# Altium footprint library IC.PcbLib: 68 footprints (part 5 of 5)
Each footprint in its own frame and in the unit in brackets; x right, y up, seen from the top. Pads: shape width x height; smd on the part's side, far side on the other; paste and mask are expansions set on the pad; w line width, h text height; cw(c..) or ccw(c..) is an arc to the next point about the centre after c.
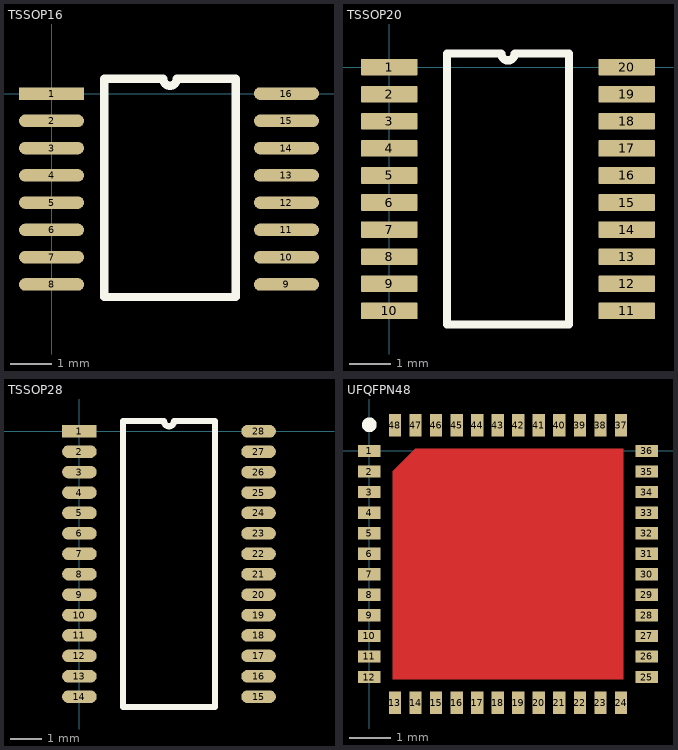
[diagram p4: the footprints below, top view; thin cyan lines are the x and y axes]

## TSSOP16 [mm]
pads (16):
  rect 1.55x0.3 smd: 1(0,0)
  oval 1.55x0.3 smd: 2(0,-0.65) 3(0,-1.3) 4(0,-1.95) 5(0,-2.6) 6(0,-3.25) 7(0,-3.9) 8(0,-4.55) 9(5.6,-4.55) 10(5.6,-3.9) 11(5.6,-3.25) 12(5.6,-2.6) 13(5.6,-1.95) 14(5.6,-1.3) 15(5.6,-0.65) 16(5.6,0)
Top Overlay:
  lines w0.2: 1.259,-4.85 1.259,0.35 2.661,0.35 ccw(c2.824,0.35) 2.986,0.35 4.389,0.35 4.389,-4.85 1.259,-4.85
3D body "User Library-tssop16-2.step": height 1.2, standoff 0, extent -0.355,-4.836 6.045,0.264

## TSSOP20 [mm]
pads (20):
  rrect10% 1.35x0.4 smd: 1(0,0) 2(0,-0.65) 3(0,-1.3) 4(0,-1.95) 5(0,-2.6) 6(0,-3.25) 7(0,-3.9) 8(0,-4.55) 9(0,-5.2) 10(0,-5.85) 11(5.7,-5.85) 12(5.7,-5.2) 13(5.7,-4.55) 14(5.7,-3.9) 15(5.7,-3.25) 16(5.7,-2.6) 17(5.7,-1.95) 18(5.7,-1.3) 19(5.7,-0.65) 20(5.7,0)
Top Overlay:
  lines w0.2: 1.385,-6.175 4.315,-6.175 4.315,0.325 3.012,0.325 cw(c2.85,0.325) 2.688,0.325 1.385,0.325 1.385,-6.175
3D body "User Library-TSSOP-20.step": height 1.2, standoff 0, extent -0.403,-6.219 6.147,0.381

## TSSOP28 [mm]
pads (28):
  rect 1.1x0.4 smd: 1(0,0)
  oval 1.1x0.4 smd: 2(0,-0.65) 3(0,-1.3) 4(0,-1.95) 5(0,-2.6) 6(0,-3.25) 7(0,-3.9) 8(0,-4.55) 9(0,-5.2) 10(0,-5.85) 11(0,-6.5) 12(0,-7.15) 13(0,-7.8) 14(0,-8.45) 15(5.7,-8.45) 16(5.7,-7.8) 17(5.7,-7.15) 18(5.7,-6.5) 19(5.7,-5.85) 20(5.7,-5.2) 21(5.7,-4.55) 22(5.7,-3.9) 23(5.7,-3.25) 24(5.7,-2.6) 25(5.7,-1.95) 26(5.7,-1.3) 27(5.7,-0.65) 28(5.7,0)
Top Overlay:
  lines w0.2: 1.385,-8.775 4.315,-8.775 4.315,0.325 3.012,0.325 cw(c2.85,0.325) 2.688,0.325 1.385,0.325 1.385,-8.775
3D body "SW3dPS-TSSOP-28_P065.STEP": height 1.02, standoff 0.03, extent -0.355,-9.09 6.045,0.61

## UFQFPN48 [mm]
pads (48):
  rect 0.55x0.3 smd: 1(0,0) 2(0,-0.5) 3(0,-1) 4(0,-1.5) 5(0,-2) 6(0,-2.5) 7(0,-3) 8(0,-3.5) 9(0,-4) 10(0,-4.5) 11(0,-5) 12(0,-5.5) 25(6.75,-5.5) 26(6.75,-5) 27(6.75,-4.5) 28(6.75,-4) 29(6.75,-3.5) 30(6.75,-3) 31(6.75,-2.5) 32(6.75,-2) 33(6.75,-1.5) 34(6.75,-1) 35(6.75,-0.5) 36(6.75,0)
  rect 0.3x0.55 smd: 13(0.625,-6.125) 14(1.125,-6.125) 15(1.625,-6.125) 16(2.125,-6.125) 17(2.625,-6.125) 18(3.125,-6.125) 19(3.625,-6.125) 20(4.125,-6.125) 21(4.625,-6.125) 22(5.125,-6.125) 23(5.625,-6.125) 24(6.125,-6.125) 37(6.125,0.625) 38(5.625,0.625) 39(5.125,0.625) 40(4.625,0.625) 41(4.125,0.625) 42(3.625,0.625) 43(3.125,0.625) 44(2.625,0.625) 45(2.125,0.625) 46(1.625,0.625) 47(1.125,0.625) 48(0.625,0.625)
Top Layer:
  region: 0.575,-5.55 6.175,-5.55 6.175,0.05 1.119,0.05 0.575,-0.489
Top Overlay:
  circle w0.254: c0,0.635 r0.051
3D body "User Library-UFQFPN48.step": height 0.55, standoff 0, extent -0.122,-6.243 6.878,0.757